# Altium footprint library RNG_Footprints.PcbLib: 134 footprints (part 9 of 9)
Each footprint in its own frame and in the unit in brackets; x right, y up, seen from the top. Pads: shape width x height; smd on the part's side, far side on the other; paste and mask are expansions set on the pad; w line width, h text height; cw(c..) or ccw(c..) is an arc to the next point about the centre after c.
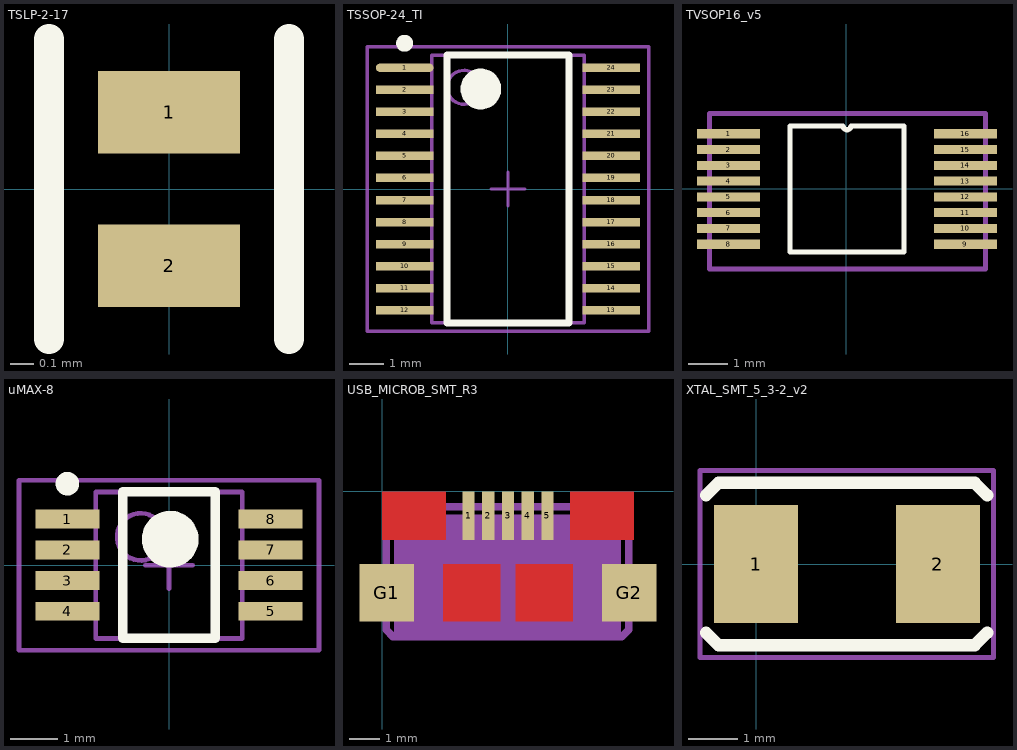
[diagram p8: the footprints below, top view; thin cyan lines are the x and y axes]

## TSLP-2-17 [mm] "PG-TSLP-2-17_Infineon_ESD0P2RF_TVS_Diode"
height 0.4
pads (2):
  rect 0.6x0.35 smd paste-0.075: 1(0,0.325) 2(0,-0.325)
Top Overlay:
  lines w0.127: -0.508,-0.635 -0.508,0.635 ; 0.508,-0.635 0.508,0.635
Top Paste:
  rectangle: -0.225,-0.464 0.225,-0.188
  rectangle: -0.225,0.188 0.225,0.464
Top Solder:
  rectangle: -0.4,-0.2 0.4,0.2
3D body: height 0.4, standoff 0, extent -0.325,-0.525 0.325,0.525

## TSSOP-24_TI [mm] "TSOP, 24-Leads, Body 7.9x4.5mm (max), Pitch 0.65mm, IPC Medium Density"
height 1.2
pads (24):
  oval 1.7x0.25 smd: 1(-3.05,3.575)
  rect 1.7x0.25 smd: 2(-3.05,2.925) 3(-3.05,2.275) 4(-3.05,1.625) 5(-3.05,0.975) 6(-3.05,0.325) 7(-3.05,-0.325) 8(-3.05,-0.975) 9(-3.05,-1.625) 10(-3.05,-2.275) 11(-3.05,-2.925) 12(-3.05,-3.575) 13(3.05,-3.575) 14(3.05,-2.925) 15(3.05,-2.275) 16(3.05,-1.625) 17(3.05,-0.975) 18(3.05,-0.325) 19(3.05,0.325) 20(3.05,0.975) 21(3.05,1.625) 22(3.05,2.275) 23(3.05,2.925) 24(3.05,3.575)
Top Overlay:
  circle w0.6: c-0.8,2.95 r0.3
  circle w0.25: c-3.05,4.3 r0.125
  lines w0.2: -1.8,-3.95 1.8,-3.95 1.8,3.95 -1.8,3.95 -1.8,-3.95
Mechanical 13:
  circle w0.1: c-1.3,3 r0.5
  lines w0.1: -2.25,-3.95 2.25,-3.95 2.25,3.95 -2.25,3.95 -2.25,-3.95
Mechanical 15:
  lines w0.1: -0.5,0 0.5,0 ; 0,-0.5 0,0.5 ; -4.15,-4.2 4.15,-4.2 4.15,4.2 -4.15,4.2 -4.15,-4.2
3D body: height 1.2, standoff 0.05, extent -2.25,-3.95 2.25,3.95

## TVSOP16_v5 [mm]
pads (16):
  rect 1.6x0.23 smd paste-0.04: 1(-2.981,1.392) 2(-2.981,0.992) 3(-2.981,0.592) 4(-2.981,0.192) 5(-2.981,-0.208) 6(-2.981,-0.608) 7(-2.981,-1.008) 8(-2.981,-1.408) 9(3.019,-1.408) 10(3.019,-1.008) 11(3.019,-0.608) 12(3.019,-0.208) 13(3.019,0.192) 14(3.019,0.592) 15(3.019,0.992) 16(3.019,1.392)
Top Overlay:
  lines w0.127: -1.419,-1.608 1.457,-1.608 1.457,1.592 0.119,1.592 cw(c0.019,1.592) -0.081,1.592 -1.419,1.592 -1.419,-1.608
  text "." at -1.049,1.011 h1.52
Mechanical 15:
  lines w0.127: -3.462,-2.037 3.523,-2.037 3.523,1.9 -3.462,1.9 -3.462,-2.037
3D body: height 1.2, standoff 0, extent -2.192,-1.91 2.308,1.79

## uMAX-8 [mm] "uMAX from Maxim, 8-Leads, Body 3.1x3.1mm (max), Pitch 0.65mm, IPC Medium Density, TSOP-like"
height 1.1
pads (8):
  rect 1.35x0.4 smd: 1(-2.15,0.975) 2(-2.15,0.325) 3(-2.15,-0.325) 4(-2.15,-0.975) 5(2.15,-0.975) 6(2.15,-0.325) 7(2.15,0.325) 8(2.15,0.975)
Top Overlay:
  circle w0.25: c-2.15,1.725 r0.125
  circle w0.6: c0.025,0.55 r0.3
  lines w0.2: -0.975,-1.55 -0.975,1.55 0.975,1.55 0.975,-1.55 -0.975,-1.55
Mechanical 13:
  circle w0.1: c-0.6,0.6 r0.5
  lines w0.1: -1.55,-1.55 -1.55,1.55 1.55,1.55 1.55,-1.55 -1.55,-1.55
Mechanical 15:
  lines w0.1: -0.5,0 0.5,0 ; 0,-0.5 0,0.5 ; -3.175,-1.8 -3.175,1.8 3.175,1.8 3.175,-1.8 -3.175,-1.8
3D body: height 1.1, standoff 0.05, extent -1.55,-1.55 1.55,1.55

## USB_MICROB_SMT_R3 [mm] "USB Micro B, Standard (bottom mount), Shell SMT, Hirose"
height 2.5
pads (7):
  rect 0.4x1.6 smd mask+0.064: 1(2.85,-0.8) 2(3.5,-0.8) 3(4.15,-0.8) 4(4.8,-0.8) 5(5.45,-0.8)
  rect 1.8x1.9 smd: G1(0.15,-3.35) G2(8.15,-3.35)
Top Layer:
  rectangle: 6.2,-1.6 8.3,0
  rectangle: 2,-4.3 3.9,-2.4
  rectangle: 4.4,-4.3 6.3,-2.4
  rectangle: 0,-1.6 2.1,0
Top Overlay:
  text "." at 2.159,0.254 h1
Mechanical 15:
  rectangle: 0.381,-4.8 7.874,-0.762
  lines w0.25: 0.127,-4.572 0.355,-4.8 0.381,-4.8 7.874,-4.8 7.9,-4.8 8.128,-4.572 8.128,-0.508 0.127,-0.508 0.127,-4.572

## XTAL_SMT_5_3-2_v2 [mm] "7A Crystal, 5 x 3.2mm body, 1.7 x 2.4mm pads"
height 1.35
pads (2):
  rect 1.7x2.4 smd: 1(0,0) 2(3.7,0)
Top Overlay:
  lines w0.25: -1.016,-1.397 -0.762,-1.651 4.445,-1.651 4.699,-1.397 ; -1.016,1.397 -0.762,1.651 4.445,1.651 4.699,1.397
Mechanical 15:
  lines w0.1: -1.143,-1.905 -1.143,1.905 4.826,1.905 4.826,-1.905 -1.143,-1.905
3D body: height 1.35, standoff 0, extent -0.725,-1.6 4.425,1.6